# Altium footprint library connecteurs.PcbLib: 162 footprints (part 3 of 11)
Each footprint in its own frame and in the unit in brackets; x right, y up, seen from the top. Pads: shape width x height; smd on the part's side, far side on the other; paste and mask are expansions set on the pad; w line width, h text height; cw(c..) or ccw(c..) is an arc to the next point about the centre after c.
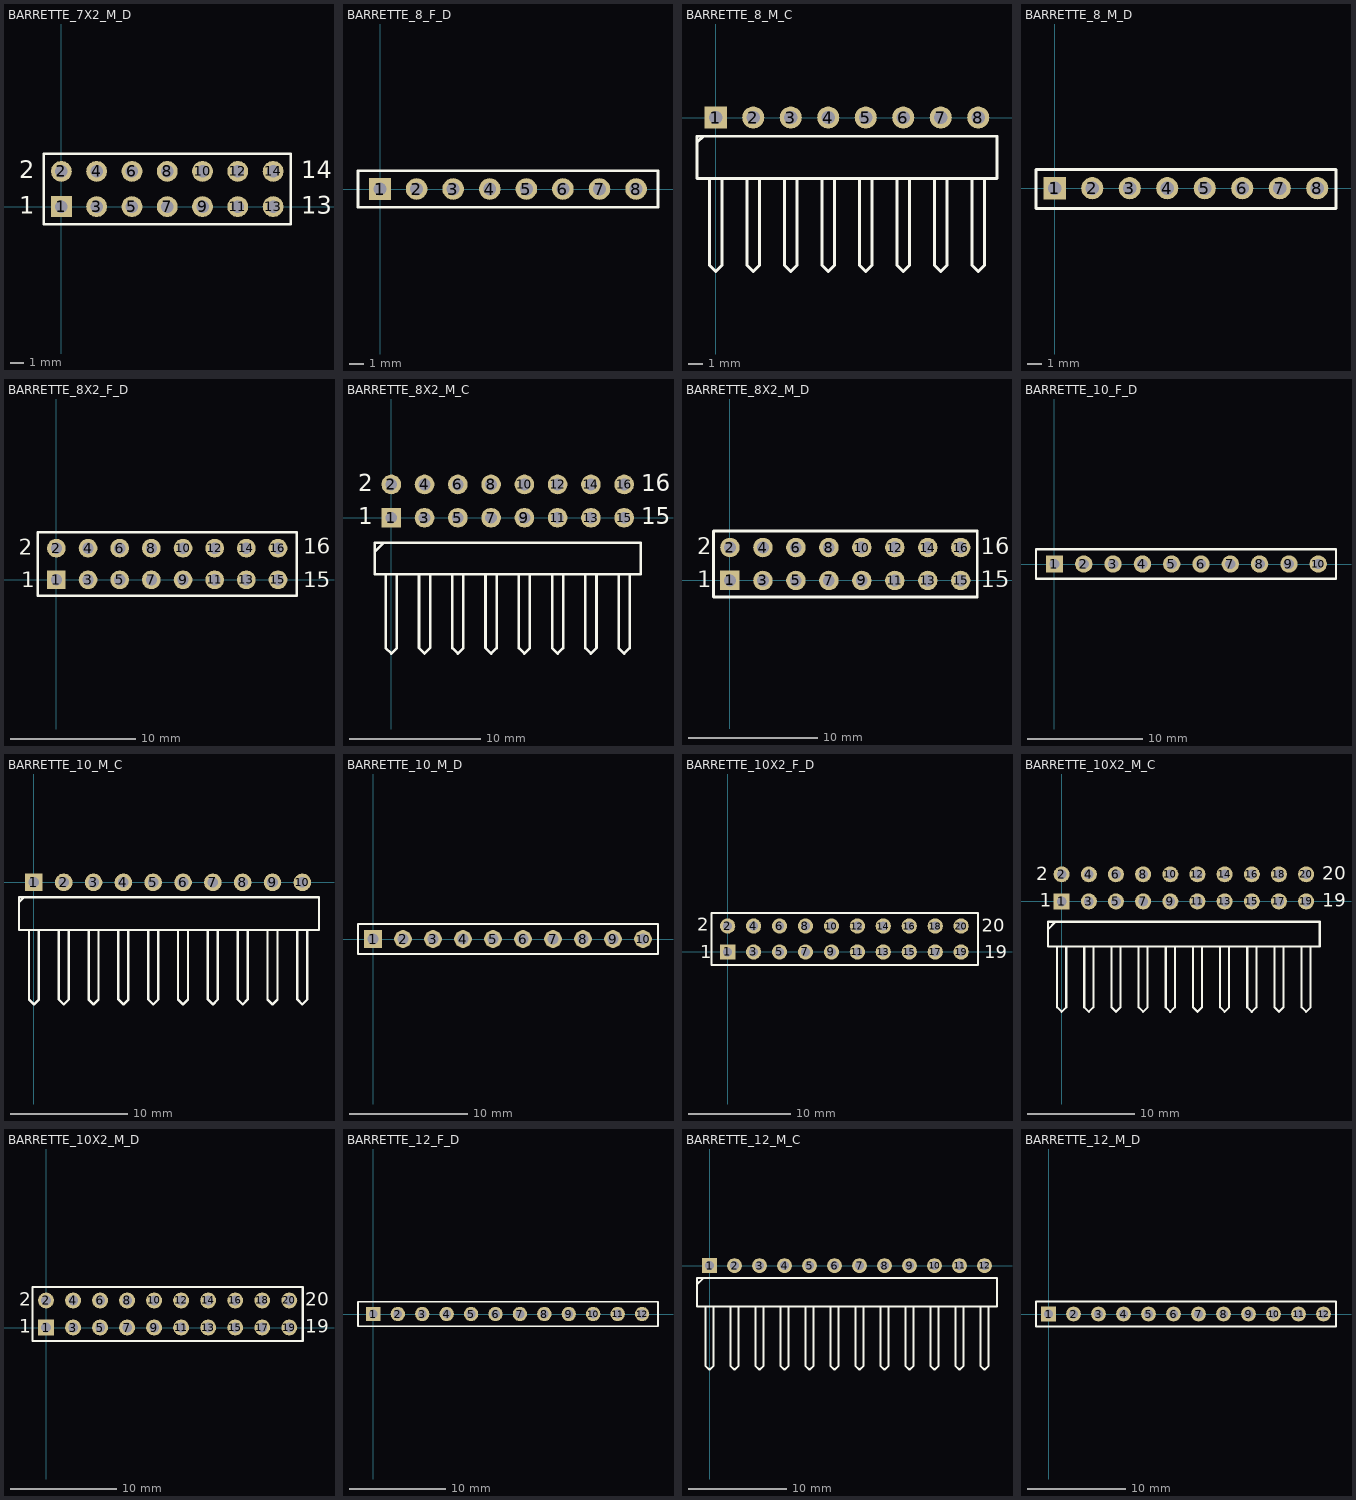
[diagram p2: the footprints below, top view; thin cyan lines are the x and y axes]

## BARRETTE_7X2_M_D [mm] "BARRETTE 7 CONTACTS ; 2 RANGEES ; DROITE ; MALE ; ESPACEMENT BROCHES = 2.54 mm"
height 9.6
pads (14):
  rect 1.5x1.5 hole 0.9: 1(0,0)
  round 1.5 hole 0.9: 2(0,2.54) 3(2.54,0) 4(2.54,2.54) 5(5.08,0) 6(5.08,2.54) 7(7.62,0) 8(7.62,2.54) 9(10.16,0) 10(10.16,2.54) 11(12.7,0) 12(12.7,2.54) 13(15.24,0) 14(15.24,2.54)
Top Overlay:
  lines w0.2: -1.27,-1.27 -1.27,3.81 16.51,3.81 16.51,-1.27 -1.27,-1.27
  text "2" at -3.048,2.032 h1.27
  text "1" at -3.048,-0.508 h1.27
  text "14" at 17.272,2.032 h1.27
  text "13" at 17.272,-0.508 h1.27
3D body: height 10.67, standoff -2.79, extent -1.3,-1.24 16.48,3.84

## BARRETTE_8_F_D [mm] "BARRETTE 8 CONTACTS ; 1 RANGEE ; DROITE ; FEMELLE ; ESPACEMENT BROCHES = 2.54 mm"
height 8.6
pads (8):
  rect 1.5x1.5 hole 0.9: 1(0,0)
  round 1.5 hole 0.9: 2(2.54,0) 3(5.08,0) 4(7.62,0) 5(10.16,0) 6(12.7,0) 7(15.24,0) 8(17.78,0)
Top Overlay:
  lines w0.2: -1.528,-1.27 19.3,-1.27 19.3,1.27 -1.528,1.27 -1.528,-1.27
3D body: height 8.5, standoff -2.65, extent -1.528,-1.213 19.3,1.2

## BARRETTE_8_M_C [mm] "BARRETTE 8 CONTACTS ; 1 RANGEE ; COUDEE ; MALE ; ESPACEMENT BROCHES = 2.54 mm"
height 2.5
pads (8):
  rect 1.5x1.5 hole 0.9: 1(0,0)
  round 1.5 hole 0.9: 2(2.54,0) 3(5.08,0) 4(7.62,0) 5(10.16,0) 6(12.7,0) 7(15.24,0) 8(17.78,0)
Top Overlay:
  lines w0.2: -1.27,-1.693 -0.847,-1.27 ; -0.423,-4.21 -0.423,-10.01 0,-10.433 0.423,-10.01 0.423,-4.19 ; 2.117,-4.17 2.117,-10.01 2.54,-10.433 2.963,-10.01 2.963,-4.18 ; 4.657,-4.17 4.657,-10.01 5.08,-10.433 5.503,-10.01 5.503,-4.2 ; 7.197,-4.17 7.197,-10.01 7.62,-10.433 8.043,-10.01 8.043,-4.18 ; 9.737,-4.15 9.737,-10.01 10.16,-10.433 10.583,-10.01 10.583,-4.16 ; 12.277,-4.15 12.277,-10.01 12.7,-10.433 13.123,-10.01 13.123,-4.16 ; 14.817,-4.15 14.817,-10.01 15.24,-10.433 15.663,-10.01 15.663,-4.17 ; 17.357,-4.18 17.357,-10.01 17.78,-10.433 18.203,-10.01 18.203,-4.18 ; -1.27,-4.14 19.05,-4.14 19.05,-1.27 -1.27,-1.27 -1.27,-4.14
3D body: height 2.65, standoff -1.85, extent -1.29,-10.01 8.87,0.31
3D body: height 2.65, standoff -1.85, extent 8.87,-10.01 19.03,0.31

## BARRETTE_8_M_D [mm] "BARRETTE 8 CONTACTS ; 1 RANGEE ; DROITE ; MALE ; ESPACEMENT BROCHES = 2.54 mm"
height 9.6
pads (8):
  rect 1.5x1.5 hole 0.9: 1(0,0)
  round 1.5 hole 0.9: 2(2.54,0) 3(5.08,0) 4(7.62,0) 5(10.16,0) 6(12.7,0) 7(15.24,0) 8(17.78,0)
Top Overlay:
  lines w0.2: -1.27,-1.38 19.05,-1.38 19.05,1.27 -1.27,1.27 -1.27,-1.38
3D body: height 10.1, standoff -1.5, extent -1.26,-1.34 19.06,1.2

## BARRETTE_8X2_F_D [mm] "BARRETTE 8 CONTACTS ; 2 RANGEES ; DROITE ; FEMELLE ; ESPACEMENT BROCHES = 2.54 mm"
height 8.6
pads (16):
  rect 1.5x1.5 hole 0.9: 1(0,0)
  round 1.5 hole 0.9: 2(0,2.54) 3(2.54,0) 4(2.54,2.54) 5(5.08,0) 6(5.08,2.54) 7(7.62,0) 8(7.62,2.54) 9(10.16,0) 10(10.16,2.54) 11(12.7,0) 12(12.7,2.54) 13(15.24,0) 14(15.24,2.54) 15(17.78,0) 16(17.78,2.54)
Top Overlay:
  lines w0.2: -1.5,-1.27 -1.5,3.81 19.3,3.81 19.3,-1.27 -1.5,-1.27
  text "2" at -3,2 h1.27
  text "1" at -2.8,-0.6 h1.27
  text "15" at 19.8,-0.6 h1.27
  text "16" at 19.8,2.1 h1.27
3D body: height 8.5, standoff -2.65, extent -1.514,-1.2 19.314,3.753

## BARRETTE_8X2_M_C [mm] "BARRETTE 8 CONTACTS ; 2 RANGEES ; COUDEE ; MALE ; ESPACEMENT BROCHES = 2.54 mm"
height 5
pads (16):
  rect 1.5x1.5 hole 0.9: 1(0,0)
  round 1.5 hole 0.9: 2(0,2.54) 3(2.54,0) 4(2.54,2.54) 5(5.08,0) 6(5.08,2.54) 7(7.62,0) 8(7.62,2.54) 9(10.16,0) 10(10.16,2.54) 11(12.7,0) 12(12.7,2.54) 13(15.24,0) 14(15.24,2.54) 15(17.78,0) 16(17.78,2.54)
Top Overlay:
  lines w0.2: -1.27,-2.605 -0.635,-1.97 ; -0.423,-4.3 -0.423,-9.94 0,-10.363 0.423,-9.94 0.423,-4.3 ; 2.117,-4.3 2.117,-9.94 2.54,-10.363 ; 2.54,-10.353 2.963,-9.93 2.963,-4.4 ; 4.657,-4.3 4.657,-9.94 5.08,-10.363 5.503,-9.94 5.503,-4.3 ; 7.197,-4.3 7.197,-9.94 7.62,-10.363 8.043,-9.94 8.043,-4.3 ; 9.737,-4.3 9.737,-9.94 10.16,-10.363 10.583,-9.94 10.583,-4.4 ; 12.277,-4.3 12.277,-9.94 12.7,-10.363 13.123,-9.94 13.123,-4.3 ; 14.817,-4.4 14.817,-9.94 15.24,-10.363 15.663,-9.94 15.663,-4.3 ; 17.357,-4.3 17.357,-9.94 17.78,-10.363 18.203,-9.94 18.203,-4.3 ; -1.27,-4.3 19.05,-4.3 19.05,-1.9 -1.27,-1.9 -1.27,-4.3
  text "16" at 19.092,2.032 h1.27
  text "15" at 19.069,-0.508 h1.27
  text "1" at -2.54,-0.508 h1.27
  text "2" at -2.54,2.032 h1.27
3D body: height 5.64, standoff -2.23, extent -1.27,-9.944 19.05,2.82

## BARRETTE_8X2_M_D [mm] "BARRETTE 8 CONTACTS ; 2 RANGEES ; DROITE ; MALE ; ESPACEMENT BROCHES = 2.54 mm"
height 9.6
pads (16):
  rect 1.5x1.5 hole 0.9: 1(0,0)
  round 1.5 hole 0.9: 2(0,2.54) 3(2.54,0) 4(2.54,2.54) 5(5.08,0) 6(5.08,2.54) 7(7.62,0) 8(7.62,2.54) 9(10.16,0) 10(10.16,2.54) 11(12.7,0) 12(12.7,2.54) 13(15.24,0) 14(15.24,2.54) 15(17.78,0) 16(17.78,2.54)
Top Overlay:
  lines w0.2: -1.27,-1.27 -1.27,3.81 19.05,3.81 19.05,-1.27 -1.27,-1.27
  text "2" at -2.54,2.032 h1.27
  text "1" at -2.54,-0.508 h1.27
  text "15" at 19.304,-0.508 h1.27
  text "16" at 19.304,2.032 h1.27
3D body: height 10.67, standoff -2.79, extent -1.3,-1.24 19.02,3.84

## BARRETTE_10_F_D [mm] "BARRETTE 10 CONTACTS ; 1 RANGEE ; DROITE ; FEMELLE ; ESPACEMENT BROCHES = 2.54 mm"
height 8.6
pads (10):
  rect 1.5x1.5 hole 0.9: 1(0,0)
  round 1.5 hole 0.9: 2(2.54,0) 3(5.08,0) 4(7.62,0) 5(10.16,0) 6(12.7,0) 7(15.24,0) 8(17.78,0) 9(20.32,0) 10(22.86,0)
Top Overlay:
  lines w0.2: -1.6,-1.27 -1.6,1.27 0.635,1.27 24.4,1.27 24.4,-1.27 -1.6,-1.27
3D body: height 8.5, standoff -2.65, extent -1.554,-1.2 24.354,1.213

## BARRETTE_10_M_C [mm] "BARRETTE 10 CONTACTS ; 1 RANGEE ; COUDEE ; MALE ; ESPACEMENT BROCHES = 2.54 mm"
height 2.5
pads (10):
  rect 1.5x1.5 hole 0.9: 1(0,0)
  round 1.5 hole 0.9: 2(2.54,0) 3(5.08,0) 4(7.62,0) 5(10.16,0) 6(12.7,0) 7(15.24,0) 8(17.78,0) 9(20.32,0) 10(22.86,0)
Top Overlay:
  lines w0.2: -1.27,-1.693 -0.847,-1.27 ; -0.423,-4.09 -0.423,-9.98 0,-10.403 0.423,-9.98 0.423,-4.08 ; 2.117,-4.08 2.117,-9.98 2.54,-10.403 2.963,-9.98 2.963,-4.09 ; 4.657,-4.07 4.657,-9.98 5.08,-10.403 5.503,-9.98 5.503,-4.06 ; 7.197,-4.07 7.197,-9.98 7.62,-10.403 8.043,-9.98 8.043,-4.08 ; 9.737,-4.07 9.737,-9.98 10.16,-10.403 10.583,-9.98 10.583,-4.06 ; 12.277,-4.08 12.277,-9.98 12.7,-10.403 13.123,-9.98 13.123,-4.09 ; 14.817,-4.08 14.817,-9.98 15.24,-10.403 15.663,-9.98 15.663,-4.11 ; 17.357,-4.1 17.357,-9.98 17.78,-10.403 18.203,-9.98 18.203,-4.06 ; 19.897,-4.09 19.897,-9.98 20.32,-10.403 20.743,-9.98 20.743,-4.08 ; 22.437,-4.08 22.437,-9.98 22.86,-10.403 23.283,-9.98 23.283,-4.07 ; -1.27,-4.06 -1.27,-1.27 0.635,-1.27 24.28,-1.27 24.28,-4.06 -1.27,-4.06
3D body: height 2.65, standoff -1.85, extent 11.45,-9.98 24.15,0.34
3D body: height 2.65, standoff -1.85, extent -1.25,-9.98 11.45,0.34

## BARRETTE_10_M_D [mm] "BARRETTE 10 CONTACTS ; 1 RANGEE ; DROITE ; MALE ; ESPACEMENT BROCHES = 2.54 mm"
height 9.6
pads (10):
  rect 1.5x1.5 hole 0.9: 1(0,0)
  round 1.5 hole 0.9: 2(2.54,0) 3(5.08,0) 4(7.62,0) 5(10.16,0) 6(12.7,0) 7(15.24,0) 8(17.78,0) 9(20.32,0) 10(22.86,0)
Top Overlay:
  lines w0.2: -1.27,-1.27 24.13,-1.27 24.13,1.27 0.635,1.27 -1.27,1.27 -1.27,-1.27
3D body: height 10.1, standoff -1.5, extent -1.3,-1.3 24.1,1.24

## BARRETTE_10X2_F_D [mm] "BARRETTE 10 CONTACTS ; 2 RANGEES ; DROITE ; FEMELLE ; ESPACEMENT BROCHES = 2.54 mm"
height 8.6
pads (20):
  rect 1.5x1.5 hole 0.9: 1(0,0)
  round 1.5 hole 0.9: 2(0,2.54) 3(2.54,0) 4(2.54,2.54) 5(5.08,0) 6(5.08,2.54) 7(7.62,0) 8(7.62,2.54) 9(10.16,0) 10(10.16,2.54) 11(12.7,0) 12(12.7,2.54) 13(15.24,0) 14(15.24,2.54) 15(17.78,0) 16(17.78,2.54) 17(20.32,0) 18(20.32,2.54) 19(22.86,0) 20(22.86,2.54)
Top Overlay:
  lines w0.2: -1.6,-1.27 0.635,-1.27 24.5,-1.27 24.5,3.81 0.635,3.81 -1.6,3.81 -1.6,-1.27
  text "20" at 24.9,2 h1.27
  text "19" at 25.1,-0.6 h1.27
  text "1" at -2.7,-0.6 h1.27
  text "2" at -3,2.1 h1.27
3D body: height 8.5, standoff -2.65, extent -1.5,-1.177 24.408,3.776

## BARRETTE_10X2_M_C [mm] "BARRETTE 10 CONTACTS ; 2 RANGEES ; COUDEE ; MALE ; ESPACEMENT BROCHES = 2.54 mm"
height 5
pads (20):
  rect 1.5x1.5 hole 0.9: 1(0,0)
  round 1.5 hole 0.9: 2(0,2.54) 3(2.54,0) 4(2.54,2.54) 5(5.08,0) 6(5.08,2.54) 7(7.62,0) 8(7.62,2.54) 9(10.16,0) 10(10.16,2.54) 11(12.7,0) 12(12.7,2.54) 13(15.24,0) 14(15.24,2.54) 15(17.78,0) 16(17.78,2.54) 17(20.32,0) 18(20.32,2.54) 19(22.86,0) 20(22.86,2.54)
Top Overlay:
  lines w0.2: -1.27,-2.605 -0.635,-1.97 ; -0.423,-4.2 -0.423,-9.9 0,-10.323 0.423,-9.9 0.423,-4.2 ; 2.117,-4.2 2.117,-9.9 2.54,-10.323 2.963,-9.9 2.963,-4.3 ; 4.657,-4.2 4.657,-9.9 5.08,-10.323 5.503,-9.9 5.503,-4.2 ; 7.197,-4.3 7.197,-9.9 7.62,-10.323 8.043,-9.9 8.043,-4.2 ; 9.737,-4.2 9.737,-9.9 10.16,-10.323 10.583,-9.9 10.583,-4.2 ; 12.277,-4.2 12.277,-9.9 12.7,-10.323 13.123,-9.9 13.123,-4.3 ; 14.817,-4.3 14.817,-9.9 15.24,-10.323 15.663,-9.9 15.663,-4.3 ; 17.357,-4.2 17.357,-9.89 17.78,-10.313 ; 17.78,-10.323 18.203,-9.9 18.203,-4.2 ; 19.897,-4.2 19.897,-9.9 20.32,-10.323 20.743,-9.9 20.743,-4.2 ; 22.437,-4.2 22.437,-9.9 22.86,-10.323 23.283,-9.9 23.283,-4.2 ; -1.27,-4.2 -1.27,-1.9 24.13,-1.9 24.13,-4.2 -1.27,-4.2
  text "1" at -2.032,-0.508 h1.27
  text "2" at -2.4,2 h1.27
  text "19" at 24.384,-0.508 h1.27
  text "20" at 24.384,2.032 h1.27
3D body: height 5.64, standoff -2.23, extent -1.3,-9.9 24.1,2.863

## BARRETTE_10X2_M_D [mm] "BARRETTE 10 CONTACTS ; 2 RANGEES ; DROITE ; MALE ; ESPACEMENT BROCHES = 2.54 mm"
height 9.6
pads (20):
  rect 1.5x1.5 hole 0.9: 1(0,0)
  round 1.5 hole 0.9: 2(0,2.54) 3(2.54,0) 4(2.54,2.54) 5(5.08,0) 6(5.08,2.54) 7(7.62,0) 8(7.62,2.54) 9(10.16,0) 10(10.16,2.54) 11(12.7,0) 12(12.7,2.54) 13(15.24,0) 14(15.24,2.54) 15(17.78,0) 16(17.78,2.54) 17(20.32,0) 18(20.32,2.54) 19(22.86,0) 20(22.86,2.54)
Top Overlay:
  lines w0.2: -1.27,-1.27 -1.27,3.81 0.635,3.81 24.13,3.81 24.13,-1.27 0.635,-1.27 -1.27,-1.27
  text "2" at -2.54,2.032 h1.27
  text "1" at -2.54,-0.508 h1.27
  text "19" at 24.384,-0.508 h1.27
  text "20" at 24.384,2.032 h1.27
3D body: height 10.67, standoff -2.79, extent -1.3,-1.24 24.1,3.84

## BARRETTE_12_F_D [mm] "BARRETTE 12 CONTACTS ; 1 RANGEE ; DROITE ; FEMELLE ; ESPACEMENT BROCHES = 2.54 mm"
height 8.6
pads (12):
  rect 1.5x1.5 hole 0.9: 1(0,0)
  round 1.5 hole 0.9: 2(2.54,0) 3(5.08,0) 4(7.62,0) 5(10.16,0) 6(12.7,0) 7(15.24,0) 8(17.78,0) 9(20.32,0) 10(22.86,0) 11(25.4,0) 12(27.94,0)
Top Overlay:
  lines w0.2: -1.6,-1.27 -1.6,1.27 0.635,1.27 29.6,1.27 29.6,-1.27 -1.6,-1.27
3D body: height 8.5, standoff -2.65, extent -1.494,-1.2 29.494,1.213

## BARRETTE_12_M_C [mm] "BARRETTE 12 CONTACTS ; 1 RANGEE ; COUDEE ; MALE ; ESPACEMENT BROCHES = 2.54 mm"
height 2.5
pads (12):
  rect 1.5x1.5 hole 0.9: 1(0,0)
  round 1.5 hole 0.9: 2(2.54,0) 3(5.08,0) 4(7.62,0) 5(10.16,0) 6(12.7,0) 7(15.24,0) 8(17.78,0) 9(20.32,0) 10(22.86,0) 11(25.4,0) 12(27.94,0)
Top Overlay:
  lines w0.2: -1.27,-1.905 -0.635,-1.27 ; -0.423,-4.16 -0.423,-10.157 0,-10.58 0.423,-10.157 0.423,-4.16 ; 2.117,-4.16 2.117,-10.15 2.54,-10.573 2.963,-10.15 2.963,-4.16 ; 4.657,-4.16 4.657,-10.15 5.08,-10.573 5.503,-10.15 5.503,-4.16 ; 7.197,-4.16 7.197,-10.15 7.62,-10.573 8.043,-10.15 8.043,-4.16 ; 9.737,-4.16 9.737,-10.15 10.16,-10.573 10.583,-10.15 10.583,-4.16 ; 12.277,-4.16 12.277,-10.15 12.7,-10.573 13.123,-10.15 13.123,-4.16 ; 14.817,-4.16 14.817,-10.15 15.24,-10.573 15.663,-10.15 15.663,-4.16 ; 17.357,-4.16 17.357,-10.15 17.78,-10.573 18.203,-10.15 18.203,-4.16 ; 19.897,-4.16 19.897,-10.15 20.32,-10.573 20.743,-10.15 20.743,-4.16 ; 22.437,-4.16 22.437,-10.15 22.86,-10.573 23.283,-10.15 23.283,-4.16 ; 24.977,-4.16 24.977,-10.15 25.4,-10.573 25.823,-10.15 25.823,-4.16 ; 27.517,-4.16 27.517,-10.15 27.94,-10.573 28.363,-10.15 28.363,-4.16 ; -1.27,-4.16 29.21,-4.16 29.21,-1.27 0.635,-1.27 -1.27,-1.27 -1.27,-4.16
3D body: height 3.18, standoff -2.2, extent 13.98,-10.15 29.22,0.33
3D body: height 3.18, standoff -2.2, extent -1.26,-10.15 13.98,0.33

## BARRETTE_12_M_D [mm] "BARRETTE 12 CONTACTS ; 1 RANGEE ; DROITE ; MALE ; ESPACEMENT BROCHES = 2.54 mm"
height 9.6
pads (12):
  rect 1.5x1.5 hole 0.9: 1(0,0)
  round 1.5 hole 0.9: 2(2.54,0) 3(5.08,0) 4(7.62,0) 5(10.16,0) 6(12.7,0) 7(15.24,0) 8(17.78,0) 9(20.32,0) 10(22.86,0) 11(25.4,0) 12(27.94,0)
Top Overlay:
  lines w0.2: -1.27,-1.27 29.21,-1.27 29.21,1.27 0.635,1.27 -1.27,1.27 -1.27,-1.27
3D body: height 10.1, standoff -1.5, extent -1.2,-1.27 29.28,1.27